# Altium footprint library 我的元件库02.PcbLib: 300 footprints (part 4 of 19)
Each footprint in its own frame and in the unit in brackets; x right, y up, seen from the top. Pads: shape width x height; smd on the part's side, far side on the other; paste and mask are expansions set on the pad; w line width, h text height; cw(c..) or ccw(c..) is an arc to the next point about the centre after c.
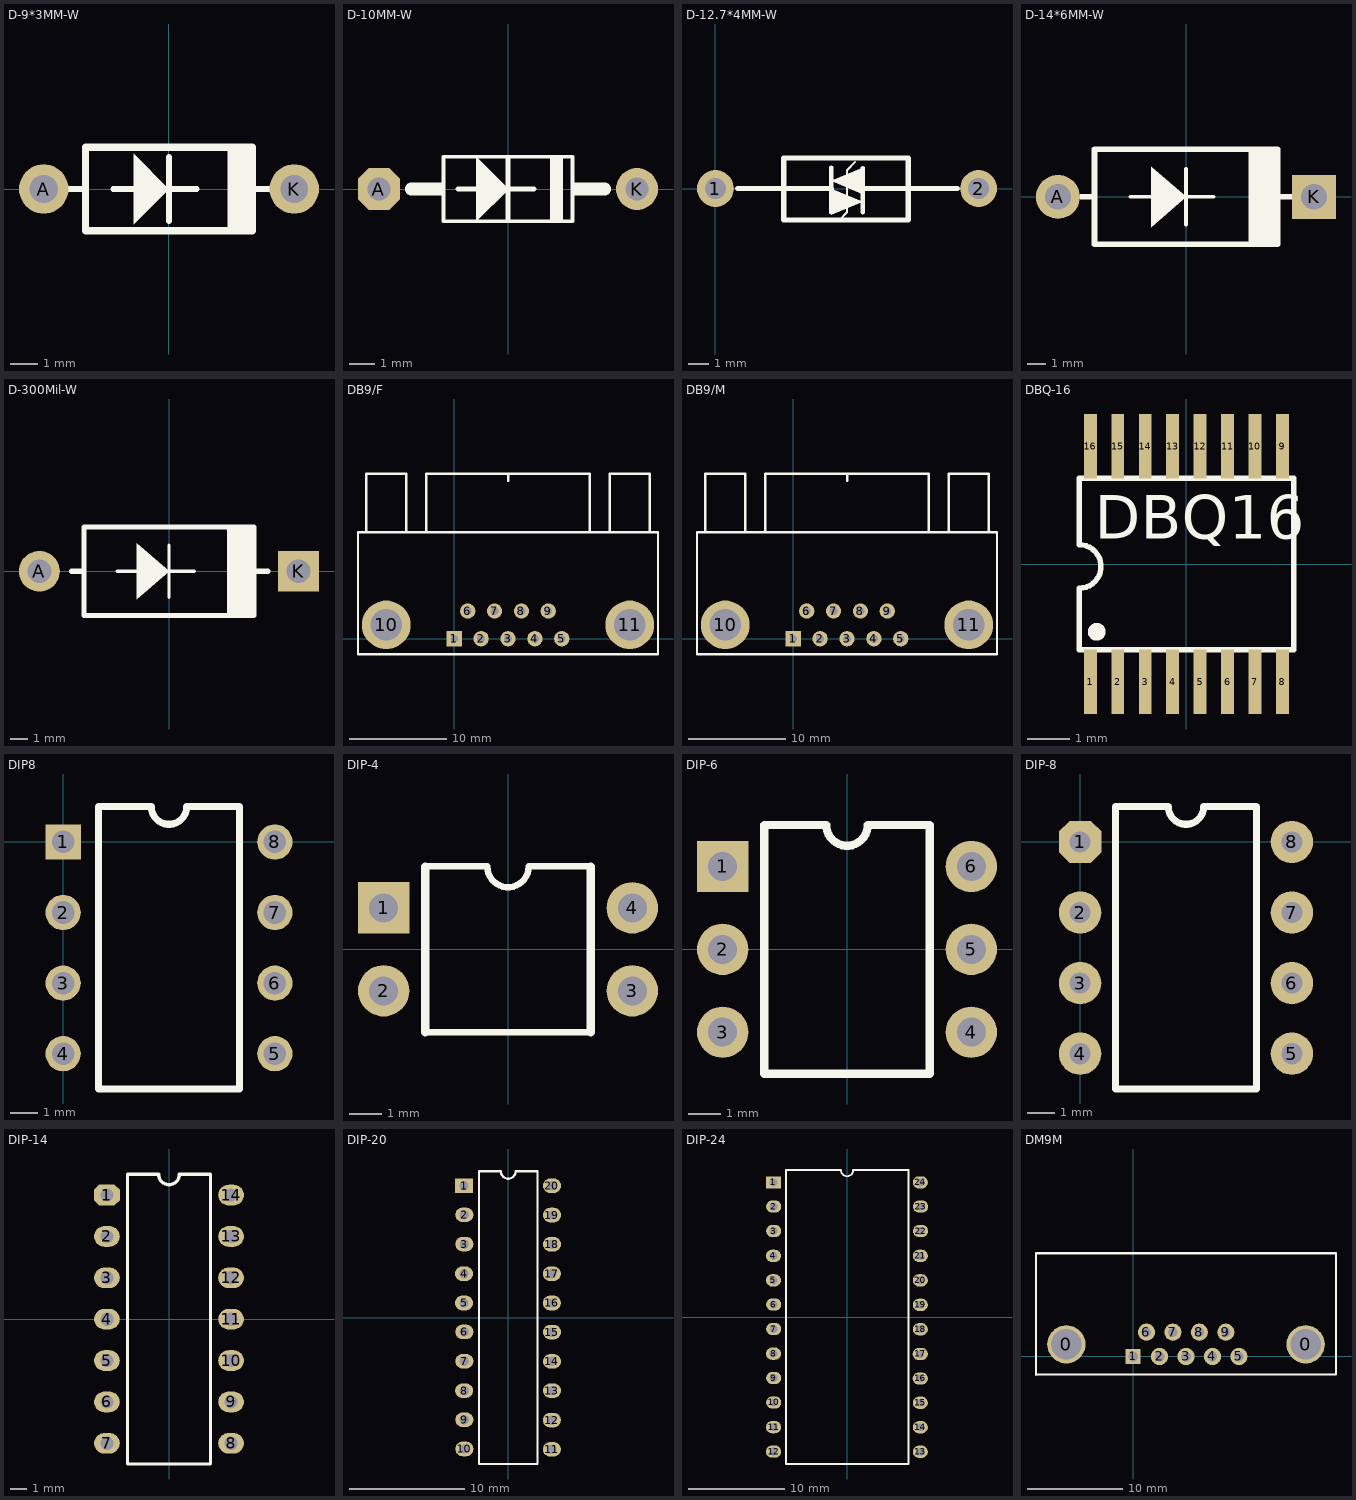
[diagram p3: the footprints below, top view; thin cyan lines are the x and y axes]

## D-9*3MM-W [mil] "1N4001系列"
height 118.11
pads (2):
  round 70 hole 40: A(-177.17,0)
  round 70 hole 39.37: K(177.17,0)
Top Overlay:
  rectangle: 87,-59.06 118.11,59.06
  region: 0,0 -50,50 -50,-50
  lines w7.87: -142,0 -118.11,0 ; -78.74,0 39.37,0 ; 0,-45.28 0,45.28 ; 119.11,0 142,0
  lines w10: 88,-59.06 88,59.06 ; -118.11,-59.06 -118.11,59.06 118.11,59.06 118.11,-59.06 -118.11,-59.06
3D body: height 100.5, standoff -100, extent -217,-50 213,51

## D-10MM-W [mil]
pads (2):
  oct 65x65 hole 35: A(-200,0)
  round 65 hole 35: K(200,0)
Top Overlay:
  rectangle: 100,-10 113,10
  region: -100,10 -113,10 -113,-10 -100,-10
  region: 85,50 65,50 65,-50 85,-50
  region: 1,0 -49,50 -49,-50
  lines w6: -100,-50 -100,50 100,50 100,-50 -100,-50
  lines w7.87: -77.74,0 40.37,0 ; 0,-45.28 0,45.28
  lines w20: -150,0 -113,0 ; 113,0 150,0
3D body: height 181.1, standoff -78.74, extent -216.75,-63.98 214.75,62

## D-12.7*4MM-W [mil]
height 196.85
pads (2):
  round 70 hole 40: 1(0,0) 2(500,0)
Top Overlay:
  region: 220,15 280,-11 280,39
  region: 280,-25 220,0 220,-50
  lines w3.94: 235,-60 250,-45 250,35 265,50
  lines w7.87: 220,-45.55 220,40 ; 280,-45 280,39
  lines w10: 41.9,0.1 220,-0.1 ; 280,-0.11 459.88,0.12 ; 130,-60 130,58.11 366.22,58.11 366.22,-60 130,-60
3D body: height 181.1, standoff -78.74, extent -15.75,-62.98 515.75,63

## D-14*6MM-W [mm] "1N5401 二极管封装"
height 10
pads (2):
  round 2.4 hole 1.4: A(-7,0)
  rect 2.4x2.4 hole 1.4: K(7,0)
Top Overlay:
  rectangle: 3.556,-2.6 5,2.6
  region: 0,0 -1.905,1.651 -1.905,-1.651
  lines w0.2: -3.048,0 1.5,0 ; 0,-1.524 0,1.524
  lines w0.305: -5.715,0 -5,0 ; 3.556,-2.565 3.556,2.6 ; 5,0 5.817,0 ; -5,-2.6 5,-2.6 5,2.6 -5,2.6 -5,-2.6

## D-300Mil-W [mm] "1N5401 二极管封装"
height 10
pads (2):
  round 2.4 hole 1.4: A(-7.62,0)
  rect 2.4x2.4 hole 1.4: K(7.62,0)
Top Overlay:
  rectangle: 3.556,-2.6 5,2.6
  region: 0,0 -1.905,1.651 -1.905,-1.651
  lines w0.2: -3.048,0 1.5,0 ; 0,-1.524 0,1.524
  lines w0.305: -5.715,0 -5,0 ; 3.556,-2.565 3.556,2.6 ; 5,0 5.817,0 ; -5,-2.6 -5,2.6 5,2.6 5,-2.6 -5,-2.6
3D body: height 7.15, standoff -1.5, extent -8.204,-2.625 8.096,2.675

## DB9/F [mm]
pads (11):
  rect 1.575x1.575 hole 0.8: 1(0,0)
  round 1.575 hole 0.8: 2(2.76,0) 3(5.52,0) 4(8.28,0) 5(11.04,0) 6(1.38,2.84) 7(4.14,2.84) 8(6.9,2.84) 9(9.66,2.84)
  round 5 hole 3.25: 10(-6.98,1.42) 11(18.02,1.42)
Top Overlay:
  lines w0.254: -9.05,10.92 -9.05,16.92 -4.94,16.92 ; -4.91,10.92 -4.91,16.92 ; -2.85,10.92 -2.85,16.92 13.9,16.92 13.9,10.92 ; 5.525,16.2 5.525,16.9 ; 15.95,10.92 15.95,16.92 20.06,16.92 ; 20.09,10.92 20.09,16.92 ; -9.88,-1.58 20.92,-1.58 20.92,10.92 -9.88,10.92 -9.88,-1.58
3D body: height 12.81, standoff -2.91, extent -9.925,-2.012 20.885,17.063

## DB9/M [mm]
pads (11):
  rect 1.575x1.575 hole 0.8: 1(0,0)
  round 1.575 hole 0.8: 2(2.76,0) 3(5.52,0) 4(8.28,0) 5(11.04,0) 6(1.38,2.84) 7(4.14,2.84) 8(6.9,2.84) 9(9.66,2.84)
  round 5 hole 3.25: 10(-6.98,1.42) 11(18.02,1.42)
Top Overlay:
  lines w0.254: -9.05,10.92 -9.05,16.92 -4.94,16.92 ; -4.91,10.92 -4.91,16.92 ; -2.85,10.92 -2.85,16.92 13.9,16.92 13.9,10.92 ; 5.525,16.2 5.525,16.9 ; 15.95,10.92 15.95,16.92 20.06,16.92 ; 20.09,10.92 20.09,16.92 ; -9.88,-1.58 20.92,-1.58 20.92,10.92 -9.88,10.92 -9.88,-1.58
3D body: height 12.75, standoff -3.65, extent -9.662,-1.803 20.838,15.897

## DBQ-16 [mm]
pads (16):
  rect 0.3x1.5 smd: 1(-2.24,-2.75) 2(-1.6,-2.75) 3(-0.96,-2.75) 4(-0.32,-2.75) 5(0.32,-2.75) 6(0.96,-2.75) 7(1.6,-2.75) 8(2.24,-2.75) 9(2.24,2.75) 10(1.6,2.75) 11(0.96,2.75) 12(0.32,2.75) 13(-0.32,2.75) 14(-0.96,2.75) 15(-1.6,2.75) 16(-2.24,2.75)
Top Overlay:
  circle w0.254: c-2.092,-1.582 r0.08
  lines w0.127: -2.5,-2 -2.5,-0.566 ccw(c-2.5,-0.058) -2.5,0.45 -2.5,2 2.5,2 2.5,-2 -2.5,-2
  text "DBQ16" at -2.134,0.584 h1.02

## DIP8 [mil]
pads (8):
  rect 50x50 hole 32: 1(0,0)
  round 50 hole 32: 2(0,-100) 3(0,-200) 4(0,-300) 5(300,-300) 6(300,-200) 7(300,-100) 8(300,0)
Top Overlay:
  lines w10: 50,-350 250,-350 250,50 175,50 cw(c150,50) 125,50 50,50 50,-350
3D body: height 188.19, standoff -109.84, extent -4.84,-363.92 305,66

## DIP-4 [mil]
pads (4):
  rect 62x62 hole 35: 1(-150,50)
  round 62 hole 35: 2(-150,-50) 3(150,-50) 4(150,50)
Top Overlay:
  lines w7.87: -100,-100 100,-100 ; -100,100 -25,100 ccw(c0,100) 25,100 100,100
  lines w10: -100,-100 -100,100 ; 100,-100 100,100
3D body: height 188.19, standoff -118.11, extent -154.61,-88.09 154.05,89.87

## DIP-6 [mil]
pads (6):
  rect 62x62 hole 35: 1(-150,100)
  round 62 hole 35: 2(-150,0) 3(-150,-100) 4(150,-100) 5(150,0) 6(150,100)
Top Overlay:
  lines w10: -100,-150 -100,150 -25,150 ccw(c0,150) 25,150 100,150 100,-150 -100,-150

## DIP-8 [mil]
pads (8):
  oct 60x60 hole 30: 1(0,0)
  round 60 hole 30: 2(0,-100) 3(0,-200) 4(0,-300) 5(300,-300) 6(300,-200) 7(300,-100) 8(300,0)
Top Overlay:
  lines w10: 50,-350 250,-350 250,50 175,50 cw(c150,50) 125,50 50,50 50,-350
3D body: height 200, standoff -98.03, extent -4.92,-364.96 304.92,64.96

## DIP-14 [mil]
pads (14):
  oct 62x50 hole 32: 1(-150,300)
  oval 62x50 hole 32: 2(-150,200) 3(-150,100) 4(-150,0) 5(-150,-100) 6(-150,-200) 7(-150,-300) 8(150,-300) 9(150,-200) 10(150,-100) 11(150,0) 12(150,100) 13(150,200) 14(150,300)
Top Overlay:
  lines w7.87: -100,-350 100,-350 100,350 25,350 cw(c0,350) -25,350 -100,350 -100,-350

## DIP-20 [mil]
pads (20):
  rect 62x50 hole 32: 1(-150.25,449.7)
  oval 62x50 hole 32: 2(-149.25,350.9) 3(-149.25,250.9) 4(-150.25,149.7) 5(-150.25,49.7) 6(-149.25,-49.1) 7(-149.25,-149.1) 8(-149.75,-249.7) 9(-149.25,-349.1) 10(-149.25,-449.1) 11(149.75,-450.3) 12(149.75,-350.3) 13(150.25,-249.7) 14(150.25,-149.7) 15(150.25,-49.7) 16(149.75,49.7) 17(149.75,149.7) 18(150.25,250.3) 19(150.25,350.3) 20(150.25,450.3)
Top Overlay:
  lines w7.87: -99.25,-500.4 100.75,-500.4 100.75,499.6 25.75,499.6 cw(c0.75,499.6) -24.25,499.6 -99.25,499.6 -99.25,-500.4

## DIP-24 [mil]
pads (24):
  rect 62x50 hole 32: 1(-300.5,550)
  oval 62x50 hole 32: 2(-299.5,451.2) 3(-299.5,351.2) 4(-300.5,250) 5(-300.5,150) 6(-299.5,51.2) 7(-299.5,-48.8) 8(-300,-149.4) 9(-299.5,-248.8) 10(-299.5,-348.8) 11(-300,-449.4) 12(-300,-549.4) 13(299.5,-550) 14(299.5,-450) 15(299.5,-350) 16(299,-250.6) 17(299,-150.6) 18(299.5,-50) 19(299.5,50) 20(299.5,150) 21(299.5,250) 22(300.5,351.2) 23(300.5,451.2) 24(299.5,550)
Top Overlay:
  lines w7.87: -249.69,-599.95 250.31,-599.95 250.31,600.05 25.31,600.05 cw(c0.31,600.05) -24.69,600.05 -249.69,600.05 -249.69,-599.95

## DM9M [mm]
pads (11):
  round 4 hole 3.2: 0(-6.985,1.27) 0(18.059,1.27)
  rect 1.575x1.575 hole 1: 1(0,0)
  round 1.8 hole 1: 2(2.769,0) 3(5.537,0) 4(8.306,0) 5(11.074,0) 6(1.397,2.54) 7(4.166,2.54) 8(6.934,2.54) 9(9.703,2.54)
Top Overlay:
  lines w0.203: -10.16,-1.905 21.234,-1.905 21.234,10.795
  lines w0.254: -10.16,-1.905 -10.16,10.795 21.234,10.795